# Altium footprint library aiskylab-14Connectors-19PWRCon.PcbLib: 63 footprints (part 2 of 4)
Each footprint in its own frame and in the unit in brackets; x right, y up, seen from the top. Pads: shape width x height; smd on the part's side, far side on the other; paste and mask are expansions set on the pad; w line width, h text height; cw(c..) or ccw(c..) is an arc to the next point about the centre after c.
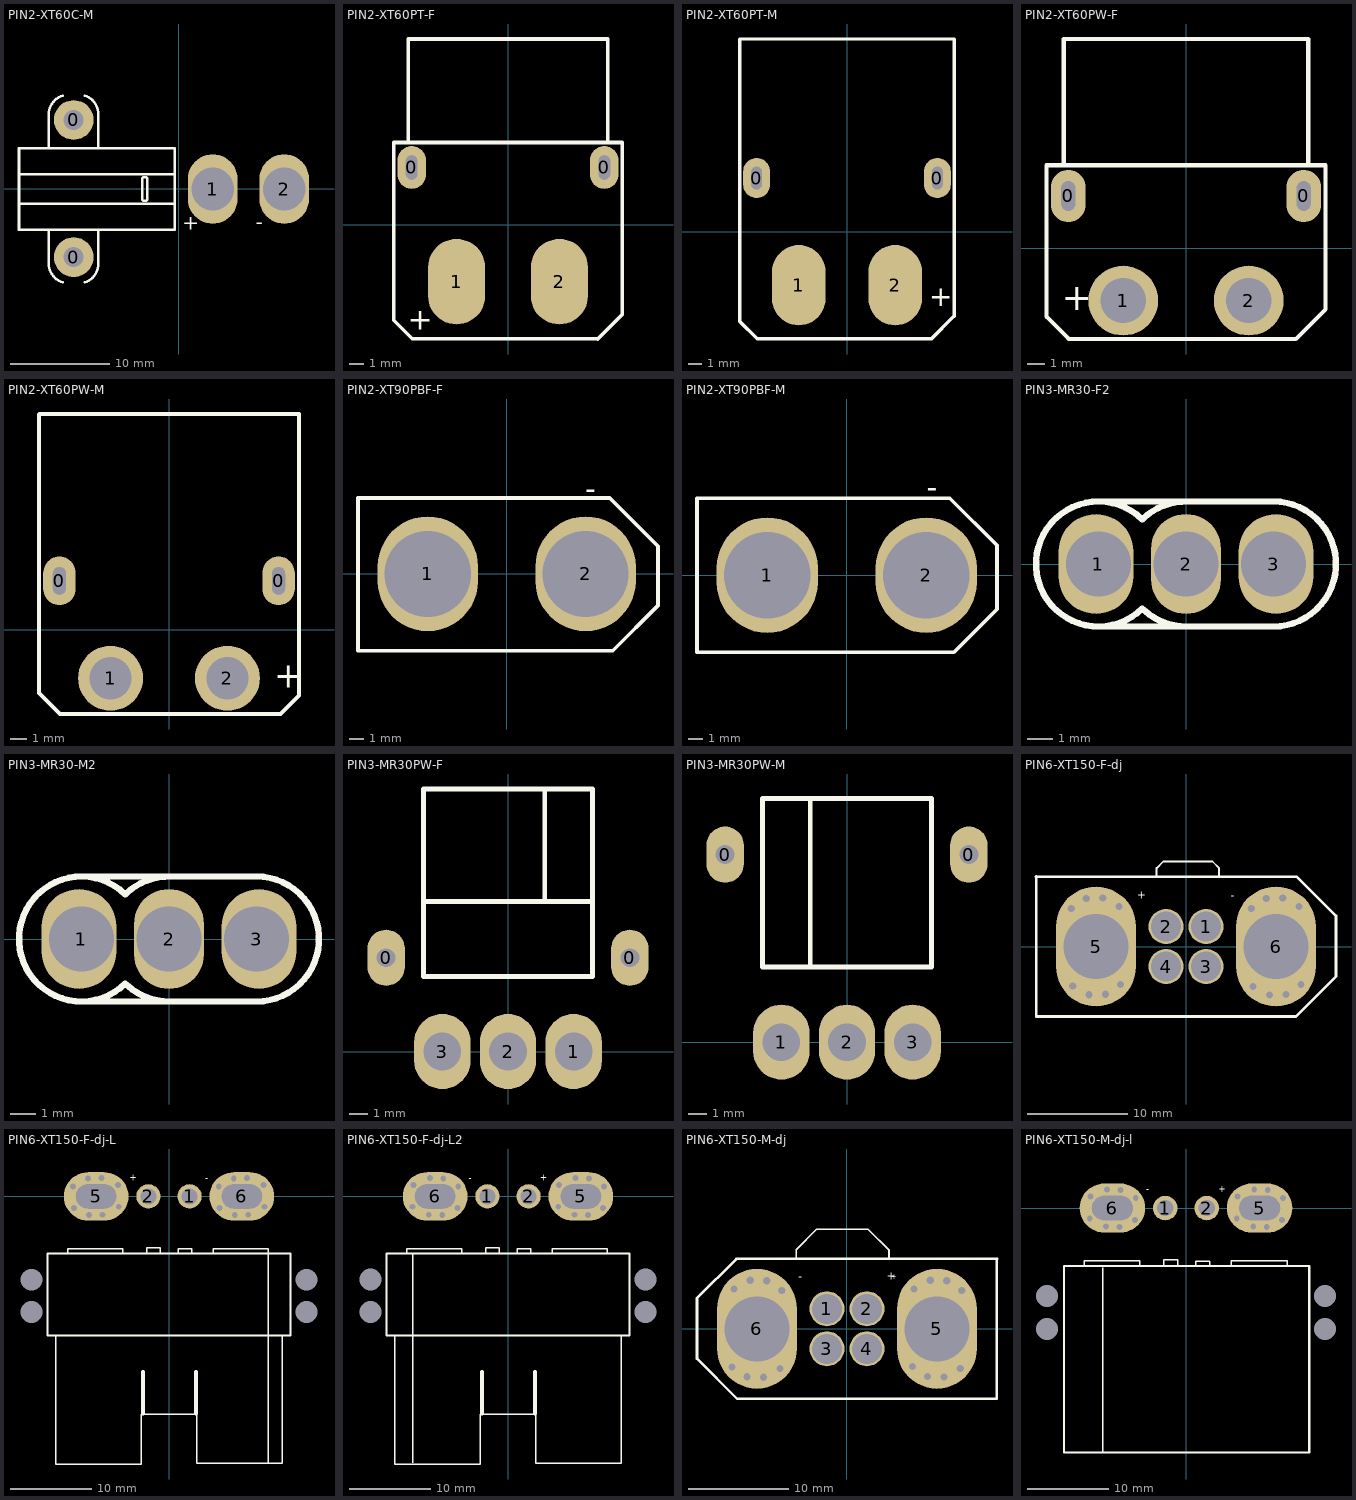
[diagram p1: the footprints below, top view; thin cyan lines are the x and y axes]

## PIN2-XT60C-M [mm]
height 24
pads (4):
  round 4 hole 2: 0(-10.6,-6.902) 0(-10.6,6.902)
  oval 5x7 hole 4.3: 1(3.4,-0.051) 2(10.6,-0.051)
Top Overlay:
  lines w0.254: -13.1,-4.146 -13.1,-4.646 -13.1,-7.546 ccw(c-11.1,-7.546) -11.7,-9.454 ; -13.1,4.054 -13.1,4.554 -13.1,7.454 cw(c-11.1,7.454) -11.7,9.361 ; -9.5,-9.454 ccw(c-10.1,-7.546) -8.1,-7.546 -8.1,-4.646 -8.1,-4.146 ; -9.5,9.361 cw(c-10.1,7.454) -8.1,7.454 -8.1,4.554 -8.1,4.054 ; -3.7,-1.121 -3.7,1.029 ; -3.6,-1.221 -3.3,-1.221 ; -3.6,1.129 -3.3,1.129 ; -3.2,-1.121 -3.2,1.029 ; -16.1,-1.546 -16.1,-4.146 -0.4,-4.146 -0.4,-1.546 ; -16.1,-1.546 -0.4,-1.546 ; -16.1,-1.546 -16.1,1.454 ; -16.1,1.454 -16.1,4.054 -0.4,4.054 -0.4,1.454 ; -16.1,1.454 -0.4,1.454 ; -0.4,-1.546 -0.4,1.454
  text "-" at 7.711,-4.089 h1.52
  text "+" at 0.32,-4.166 h1.52
Bottom Overlay:
  text "-" at 8.702,-4.115 h1.52
  text "+" at 1.375,-4.115 h1.52
Board:
  lines w0.013: -3.7,-1.121 ccw(c-3.6,-1.121) -3.6,-1.221 ; -3.7,1.029 cw(c-3.6,1.029) -3.6,1.129 ; -3.3,-1.221 ccw(c-3.3,-1.121) -3.2,-1.121 ; -3.3,1.129 cw(c-3.3,1.029) -3.2,1.029
Top Designator:
  text ".Designator" at -9.13,-0.554 h1.52
3D body "XT60C-M.STEP": height 20, standoff 0, extent -16.082,-9.433 4.418,9.383

## PIN2-XT60PT-F [mm]
height 24
pads (4):
  oval 2x3 hole 0.8 slot 1.7 at 90 deg: 0(-6.75,4) 0(6.75,4)
  oval 4x6 smd: 1(-3.6,-4) 2(3.6,-4)
Top Overlay:
  lines w0.254: -8.001,5.747 7.924,5.747 ; -8,5.747 -8,-6.712 -6.712,-8 6.306,-8 ; -7,5.746 -7,13 6.985,13 ; 6.287,-8.019 8.001,-6.305 8.001,5.747 ; 7,5.746 7,13
  text "+" at -7.01,-7.359 h1.52
Bottom Overlay:
  text "+" at -6.02,-7.385 h1.52
Top Designator:
  text ".Designator" at -7.618,1.832 h1.52
3D body "XT60PT-F.STEP": height 8.1, standoff -1.9, extent -7.925,-8.56 7.975,13.24

## PIN2-XT60PT-M [mm]
height 24
pads (4):
  oval 2x3 hole 0.8 slot 1.7 at 90 deg: 0(-6.75,4) 0(6.75,4)
  oval 4x6 smd: 1(-3.6,-4) 2(3.6,-4)
Top Overlay:
  lines w0.254: -8,14.383 -8,-6.712 -6.712,-8 6.306,-8 ; -7.949,14.383 7.976,14.383 ; 6.287,-8.019 7.981,-6.325 ; 8,-6.325 8,14.383
  text "+" at 6.147,-5.581 h1.52
Bottom Overlay:
  text "+" at 7.137,-5.556 h1.52
Top Designator:
  text ".Designator" at -7.618,2.574 h1.52
3D body "XT60PT-M.STEP": height 8.1, standoff -1.9, extent -7.95,-8.345 7.95,14.455

## PIN2-XT60PW-F [mm]
height 24
pads (4):
  oval 2x3 hole 0.8 slot 1.7 at 90 deg: 0(-6.75,3) 0(6.75,3)
  round 4 hole 2.6: 1(-3.6,-3) 2(3.6,-3)
Top Overlay:
  lines w0.254: -8,4.754 -8,-3.915 -6.712,-5.203 6.306,-5.203 8,-3.509 8,4.754 ; -7.95,4.754 7.95,4.754 ; -7,4.746 -7,12 ; -6.96,12 7,12 7,4.746
  text "+" at -7.112,-3.559 h1.52
Bottom Overlay:
  text "+" at -6.096,-3.559 h1.52
Top Designator:
  text ".Designator" at -7.618,3.025 h1.52
3D body "XT60PW-F.STEP": height 8.49, standoff -2.01, extent -7.925,-4.905 7.975,12.395

## PIN2-XT60PW-M [mm]
height 24
pads (4):
  oval 2x3 hole 0.8 slot 1.7 at 90 deg: 0(-6.75,3) 0(6.75,3)
  round 4 hole 2.6: 1(-3.6,-3) 2(3.6,-3)
Top Overlay:
  lines w0.254: 7.95,13.281 -7.975,13.281 -8,13.256 -8,-3.915 -6.712,-5.203 6.862,-5.203 8,-4.065 8,13.281
  text "+" at 6.477,-3.584 h1.52
Bottom Overlay:
  text "+" at 7.493,-3.635 h1.52
Top Designator:
  text ".Designator" at -7.618,3.531 h1.52
3D body "XT60PW-M.STEP": height 0.4, standoff -10.1, extent -8.026,-4.936 7.874,13.364

## PIN2-XT90PBF-F [mm]
height 24
pads (2):
  oval 7x8 hole 6: 1(-5.5,0) 2(5.5,0)
Top Overlay:
  lines w0.254: -10.363,-5.004 -10.363,5.283 7.188,5.283 10.541,1.93 10.541,-2.21 7.391,-5.359 -10.363,-5.359 -10.363,0.356
  text "-" at 5.461,5.207 h1.52
Bottom Overlay:
  text "-" at 6.477,5.207 h1.52
Top Designator:
  text ".Designator" at -7.541,-0.141 h1.52
3D body "XT90PB-F.STEP": height 19.7, standoff -2.8, extent -10.574,-5.49 10.726,5.41

## PIN2-XT90PBF-M [mm]
height 24
pads (2):
  oval 7x8 hole 6: 1(-5.5,0) 2(5.5,0)
Top Overlay:
  lines w0.254: -10.363,-5.004 -10.363,5.334 7.137,5.334 10.4,2.071 10.4,-2.351 7.417,-5.334 -10.363,-5.334 -10.363,0.356
  text "-" at 5.537,5.359 h1.52
Bottom Overlay:
  text "-" at 6.528,5.334 h1.52
Top Designator:
  text ".Designator" at -7.592,-0.052 h1.52
3D body "XT90PB-M.STEP": height 21, standoff -2.5, extent -10.625,-5.464 10.675,5.436

## PIN3-MR30-F2 [mm]
height 24
pads (3):
  oval 3x4 hole 2.6 copper offset -0.1,0: 1(-3.5,0)
  oval 2.8x4 hole 2.6: 2(0,0)
  oval 3x4 hole 2.6 copper offset 0.1,0: 3(3.5,0)
Top Overlay:
  lines w0.254: -3.5,-2.5 3.5,-2.5 ccw(c3.5,0) 3.5,2.5 -3.5,2.5 ; -1.754,1.781 cw(c0,0) -0.172,2.494 ; -1.75,1.785 ccw(c-3.5,0) -1.749,-1.784 ; -1.706,-1.828 ccw(c0,0) 0.055,-2.499
Top Designator:
  text ".Designator" at -7.621,-0.541 h1.52
3D body "MR30-F2.STEP": height 9.61, standoff -2.79, extent -6.153,-2.692 6.147,2.608

## PIN3-MR30-M2 [mm]
height 24
pads (3):
  oval 3x4 hole 2.6 copper offset -0.1,0: 1(-3.5,0)
  oval 2.8x4 hole 2.6: 2(0,0)
  oval 3x4 hole 2.6 copper offset 0.1,0: 3(3.5,0)
Top Overlay:
  lines w0.254: -3.5,-2.5 3.5,-2.5 ccw(c3.5,0) 3.5,2.5 -3.5,2.5 ; -1.754,1.781 cw(c0,0) -0.172,2.494 ; -1.75,1.785 ccw(c-3.5,0) -1.749,-1.784 ; -1.706,-1.828 ccw(c0,0) 0.055,-2.499
Top Designator:
  text ".Designator" at -7.621,-0.541 h1.52
3D body "MR30-M2.STEP": height 10.51, standoff -2.89, extent -6.153,-2.692 6.147,2.608

## PIN3-MR30PW-F [mm]
height 24
pads (5):
  oval 2x3 hole 1: 0(-6.5,5) 0(6.5,5)
  oval 3x4 hole 2: 1(3.5,0) 2(0,0) 3(-3.5,0)
Top Overlay:
  lines w0.254: -4.5,14 -4.5,4 4.5,4 4.5,14 ; -4.47,14 4.496,14 ; -4.445,8 4.47,8 ; 1.956,8 1.956,14
Top Designator:
  text ".Designator" at -7.643,5.505 h1.52
3D body "MR30PW-F.STEP": height 4.9, standoff -2.05, extent -7.675,-0.905 7.625,13.995

## PIN3-MR30PW-M [mm]
height 24
pads (5):
  oval 2x3 hole 1: 0(-6.5,10) 0(6.5,10)
  oval 3x4 hole 2: 1(-3.5,0) 2(0,0) 3(3.5,0)
Top Overlay:
  lines w0.254: -4.5,4.013 -4.5,13 ; -4.496,4.008 4.5,4.008 4.5,13 ; -4.47,13 4.496,13 ; -1.981,13 cw(c-1.981,12.975) -1.956,12.975 -1.956,4.089
Top Designator:
  text ".Designator" at -7.613,5.005 h1.52
3D body "MR30PW-M.STEP": height 4.9, standoff -2.05, extent -7.645,-0.864 7.655,13.086

## PIN6-XT150-F-dj [mm]
height 24
pads (6):
  round 3.5 hole 3: 1(2,2) 2(-2,2) 3(2,-2) 4(-2,-2)
  oval 8x12 hole 6.5: 5(-9,0) 6(9,0)
via -6.706,3.988 diameter 1.27 hole 0.711
via -8.331,4.851 diameter 1.27 hole 0.711
via -9.982,4.801 diameter 1.27 hole 0.711
via -11.481,3.81 diameter 1.27 hole 0.711
via -6.562,-3.785 diameter 1.27 hole 0.711
via -8.06,-4.775 diameter 1.27 hole 0.711
via -9.711,-4.826 diameter 1.27 hole 0.711
via -11.337,-3.962 diameter 1.27 hole 0.711
via 11.481,-3.81 diameter 1.27 hole 0.711
via 9.982,-4.801 diameter 1.27 hole 0.711
via 8.331,-4.851 diameter 1.27 hole 0.711
via 6.706,-3.988 diameter 1.27 hole 0.711
via 6.519,3.81 diameter 1.27 hole 0.711
via 8.018,4.801 diameter 1.27 hole 0.711
via 9.669,4.851 diameter 1.27 hole 0.711
via 11.294,3.988 diameter 1.27 hole 0.711
Top Overlay:
  lines w0.178: -2.946,7.112 -2.946,7.671 ; -2.946,7.29 -2.946,7.849 -2.286,8.509 2.642,8.509 3.302,7.849 3.302,6.96
  lines w0.254: -15.011,7 11.059,7 15,3.059 15,-2.983 10.983,-7 -15,-7 -15,7.01
  text "-" at 4.47,5.309 h0.76
  text "+" at -4.877,5.486 h0.76
Bottom Overlay:
  text "-" at 4.978,5.309 h0.76
  text "+" at -4.369,5.486 h0.76
  text "+" at -4.473,5.315 h0.51
Top Designator:
  text ".Designator" at -7.668,0.988 h1.52
3D body "AS150U-F.STEP": height 25.14, standoff -7.06, extent -16.501,-8.159 16.399,11.151

## PIN6-XT150-F-dj-L [mm]
height 24
pads (8):
  round 0 hole 2.7: 0(-17,-14.295) 0(-17,-10.295) 0(17,-14.295) 0(17,-10.295)
  round 3 hole 2: 1(2.54,0) 2(-2.54,0)
  oval 8x6 hole 3 slot 5 at 0 deg: 5(-9,0) 6(9,0)
via 11.786,-1.27 diameter 1.27 hole 0.711
via 9.779,-2.261 diameter 1.27 hole 0.711
via 8.128,-2.311 diameter 1.27 hole 0.711
via 6.248,-1.448 diameter 1.27 hole 0.711
via 6.147,1.219 diameter 1.27 hole 0.711
via 8.001,2.21 diameter 1.27 hole 0.711
via 9.652,2.261 diameter 1.27 hole 0.711
via 11.684,1.397 diameter 1.27 hole 0.711
via -6.316,1.397 diameter 1.27 hole 0.711
via -8.348,2.261 diameter 1.27 hole 0.711
via -9.999,2.21 diameter 1.27 hole 0.711
via -11.853,1.219 diameter 1.27 hole 0.711
via -11.752,-1.448 diameter 1.27 hole 0.711
via -9.872,-2.311 diameter 1.27 hole 0.711
via -8.221,-2.261 diameter 1.27 hole 0.711
via -6.214,-1.27 diameter 1.27 hole 0.711
Top Overlay:
  lines w0.178: -14,-17.196 -14,-33.071 -3.454,-33.071 -3.404,-33.02 -3.404,-26.949 3.454,-26.949 3.454,-32.995 14,-32.995 14,-17.323 ; -12.522,-7.087 -12.522,-6.452 -5.715,-6.452 -5.715,-7.137 ; -2.769,-6.96 -2.769,-6.325 -1.084,-6.325 -1.084,-7.01 ; 1.118,-7.112 1.118,-6.477 2.802,-6.477 2.802,-7.163 ; 5.478,-7.087 5.478,-6.452 12.285,-6.452 12.285,-7.137 ; 12.268,-32.944 12.268,-7.214 ; 14.097,-7.061 14.122,-7.087
  lines w0.254: -15,-17.196 15,-17.196 15,-7.087 -15,-7.087 -15,-17.196
  lines w0.5: -3.226,-26.848 -3.226,-21.692 ; 3.353,-26.848 3.353,-21.692
  text "-" at 4.47,2.515 h0.76
  text "+" at -4.877,2.692 h0.76
Bottom Overlay:
  text "-" at 4.978,2.515 h0.76
  text "+" at -4.369,2.692 h0.76
  text "+" at -4.473,2.521 h0.51
Top Designator:
  text ".Designator" at -7.72,-15.537 h1.52
3D body "XT150压条.STEP": height 18, standoff 3, extent -19.102,-16.344 18.898,-8.344
3D body "AS150U-F.STEP": height 19.98, standoff 0.67, extent -16.272,-33.013 16.628,-0.813

## PIN6-XT150-F-dj-L2 [mm]
height 24
pads (8):
  round 0 hole 2.7: 0(-17,-14.27) 0(-17,-10.27) 0(17,-14.27) 0(17,-10.27)
  round 3 hole 2: 1(-2.54,0) 2(2.54,0)
  oval 8x6 hole 3 slot 5 at 0 deg: 5(9,0) 6(-9,0)
via -11.786,-1.27 diameter 1.27 hole 0.711
via -9.779,-2.261 diameter 1.27 hole 0.711
via -8.128,-2.311 diameter 1.27 hole 0.711
via -6.248,-1.448 diameter 1.27 hole 0.711
via -6.147,1.219 diameter 1.27 hole 0.711
via -8.001,2.21 diameter 1.27 hole 0.711
via -9.652,2.261 diameter 1.27 hole 0.711
via -11.684,1.397 diameter 1.27 hole 0.711
via 6.316,1.397 diameter 1.27 hole 0.711
via 8.348,2.261 diameter 1.27 hole 0.711
via 9.999,2.21 diameter 1.27 hole 0.711
via 11.853,1.219 diameter 1.27 hole 0.711
via 11.752,-1.448 diameter 1.27 hole 0.711
via 9.872,-2.311 diameter 1.27 hole 0.711
via 8.221,-2.261 diameter 1.27 hole 0.711
via 6.214,-1.27 diameter 1.27 hole 0.711
Top Overlay:
  lines w0.178: -14,-17.196 -14,-33.071 -3.454,-33.071 -3.404,-33.02 -3.404,-26.949 3.454,-26.949 3.454,-32.995 14,-32.995 14,-17.323 ; -12.522,-7.087 -12.522,-6.452 -5.715,-6.452 -5.715,-7.137 ; -11.786,-32.918 -11.786,-7.188 ; -2.769,-6.96 -2.769,-6.325 -1.084,-6.325 -1.084,-7.01 ; 1.118,-7.112 1.118,-6.477 2.802,-6.477 2.802,-7.163 ; 5.478,-7.087 5.478,-6.452 12.285,-6.452 12.285,-7.137 ; 14.097,-7.061 14.122,-7.087
  lines w0.254: -15,-17.196 15,-17.196 15,-7.087 -15,-7.087 -15,-17.196
  lines w0.5: -3.226,-26.848 -3.226,-21.692 ; 3.353,-26.848 3.353,-21.692
  text "-" at -4.47,2.515 h0.76
  text "+" at 4.877,2.692 h0.76
Bottom Overlay:
  text "-" at -4.978,2.515 h0.76
  text "+" at 4.369,2.692 h0.76
  text "+" at 4.473,2.521 h0.51
Top Designator:
  text ".Designator" at -7.72,-15.537 h1.52
3D body "XT150压条.STEP": height 18, standoff 3, extent -19.102,-16.319 18.898,-8.319
3D body "AS150U-F.STEP": height 19.98, standoff 0.67, extent -16.272,-33.013 16.628,-0.813

## PIN6-XT150-M-dj [mm]
height 24
pads (6):
  round 3.5 hole 3: 1(-2,2) 2(2,2) 3(-2,-2) 4(2,-2)
  oval 8x12 hole 6.5: 5(9,0) 6(-9,0)
via -11.294,3.988 diameter 1.27 hole 0.711
via -9.669,4.851 diameter 1.27 hole 0.711
via -8.018,4.801 diameter 1.27 hole 0.711
via -6.519,3.81 diameter 1.27 hole 0.711
via -6.706,-3.988 diameter 1.27 hole 0.711
via -8.331,-4.851 diameter 1.27 hole 0.711
via -9.982,-4.801 diameter 1.27 hole 0.711
via -11.481,-3.81 diameter 1.27 hole 0.711
via 11.337,-3.962 diameter 1.27 hole 0.711
via 9.711,-4.826 diameter 1.27 hole 0.711
via 8.06,-4.775 diameter 1.27 hole 0.711
via 6.562,-3.785 diameter 1.27 hole 0.711
via 11.481,3.81 diameter 1.27 hole 0.711
via 9.982,4.801 diameter 1.27 hole 0.711
via 8.331,4.851 diameter 1.27 hole 0.711
via 6.706,3.988 diameter 1.27 hole 0.711
Top Overlay:
  lines w0.178: -5.08,6.96 -5.08,7.899 ; -5.08,7.925 -3.048,9.957 2.108,9.957 4.216,7.849 4.216,7.29 ; 4.216,7.112 4.216,7.671
  lines w0.254: 15,7.01 15,-7 -10.983,-7 -15,-2.983 -15,3.059 -11.059,7 15.011,7
  text "-" at -4.47,5.436 h0.76
  text "+" at 4.877,5.613 h0.76
  text "+" at 4.445,4.978 h0.51
Bottom Overlay:
  text "-" at -4.978,5.436 h0.76
  text "+" at 4.369,5.613 h0.76
Top Designator:
  text ".Designator" at -7.617,1.12 h1.52
3D body "AS150U-M.STEP": height 21.96, standoff -3.94, extent -16.45,-8.022 16.45,11.278

## PIN6-XT150-M-dj-l [mm]
height 24
pads (8):
  round 0 hole 2.7: 0(-17,-14.778) 0(-17,-10.778) 0(17,-14.778) 0(17,-10.778)
  round 3 hole 2: 1(-2.54,0) 2(2.54,0)
  oval 8x6 hole 3 slot 5 at 0 deg: 5(9,0) 6(-9,0)
via -11.786,-1.27 diameter 1.27 hole 0.711
via -9.779,-2.261 diameter 1.27 hole 0.711
via -8.128,-2.311 diameter 1.27 hole 0.711
via -6.248,-1.448 diameter 1.27 hole 0.711
via -6.147,1.219 diameter 1.27 hole 0.711
via -8.001,2.21 diameter 1.27 hole 0.711
via -9.652,2.261 diameter 1.27 hole 0.711
via -11.684,1.397 diameter 1.27 hole 0.711
via 6.316,1.397 diameter 1.27 hole 0.711
via 8.348,2.261 diameter 1.27 hole 0.711
via 9.999,2.21 diameter 1.27 hole 0.711
via 11.853,1.219 diameter 1.27 hole 0.711
via 11.752,-1.448 diameter 1.27 hole 0.711
via 9.872,-2.311 diameter 1.27 hole 0.711
via 8.221,-2.261 diameter 1.27 hole 0.711
via 6.214,-1.27 diameter 1.27 hole 0.711
Top Overlay:
  lines w0.178: -12.446,-7.087 -12.446,-6.452 -5.639,-6.452 -5.639,-7.137 ; -10.211,-29.921 -10.211,-7.29 ; -2.692,-6.96 -2.692,-6.325 -1.008,-6.325 -1.008,-7.01 ; 1.194,-7.112 1.194,-6.477 2.879,-6.477 2.879,-7.163 ; 5.554,-7.087 5.554,-6.452 12.361,-6.452 12.361,-7.137 ; 14.173,-7.061 14.199,-7.087
  lines w0.254: -14.924,-29.896 -14.924,-7.087 15.076,-7.087 15.076,-29.896 -14.924,-29.896
  text "-" at -4.47,2.515 h0.76
  text "+" at 4.877,2.692 h0.76
Bottom Overlay:
  text "-" at -4.978,2.515 h0.76
  text "+" at 4.369,2.692 h0.76
  text "+" at 4.473,2.521 h0.51
Top Designator:
  text ".Designator" at -7.72,-13.968 h1.52
3D body "AS150U-M.STEP": height 19.47, standoff 0.17, extent -16.399,-29.862 16.501,-3.962
3D body "XT150压条.STEP": height 18, standoff 3, extent -19.102,-16.827 18.898,-8.827